# Altium footprint library Reflow3D1411sep.PcbLib: 657 footprints (part 36 of 42)
Each footprint in its own frame and in the unit in brackets; x right, y up, seen from the top. Pads: shape width x height; smd on the part's side, far side on the other; paste and mask are expansions set on the pad; w line width, h text height; cw(c..) or ccw(c..) is an arc to the next point about the centre after c.
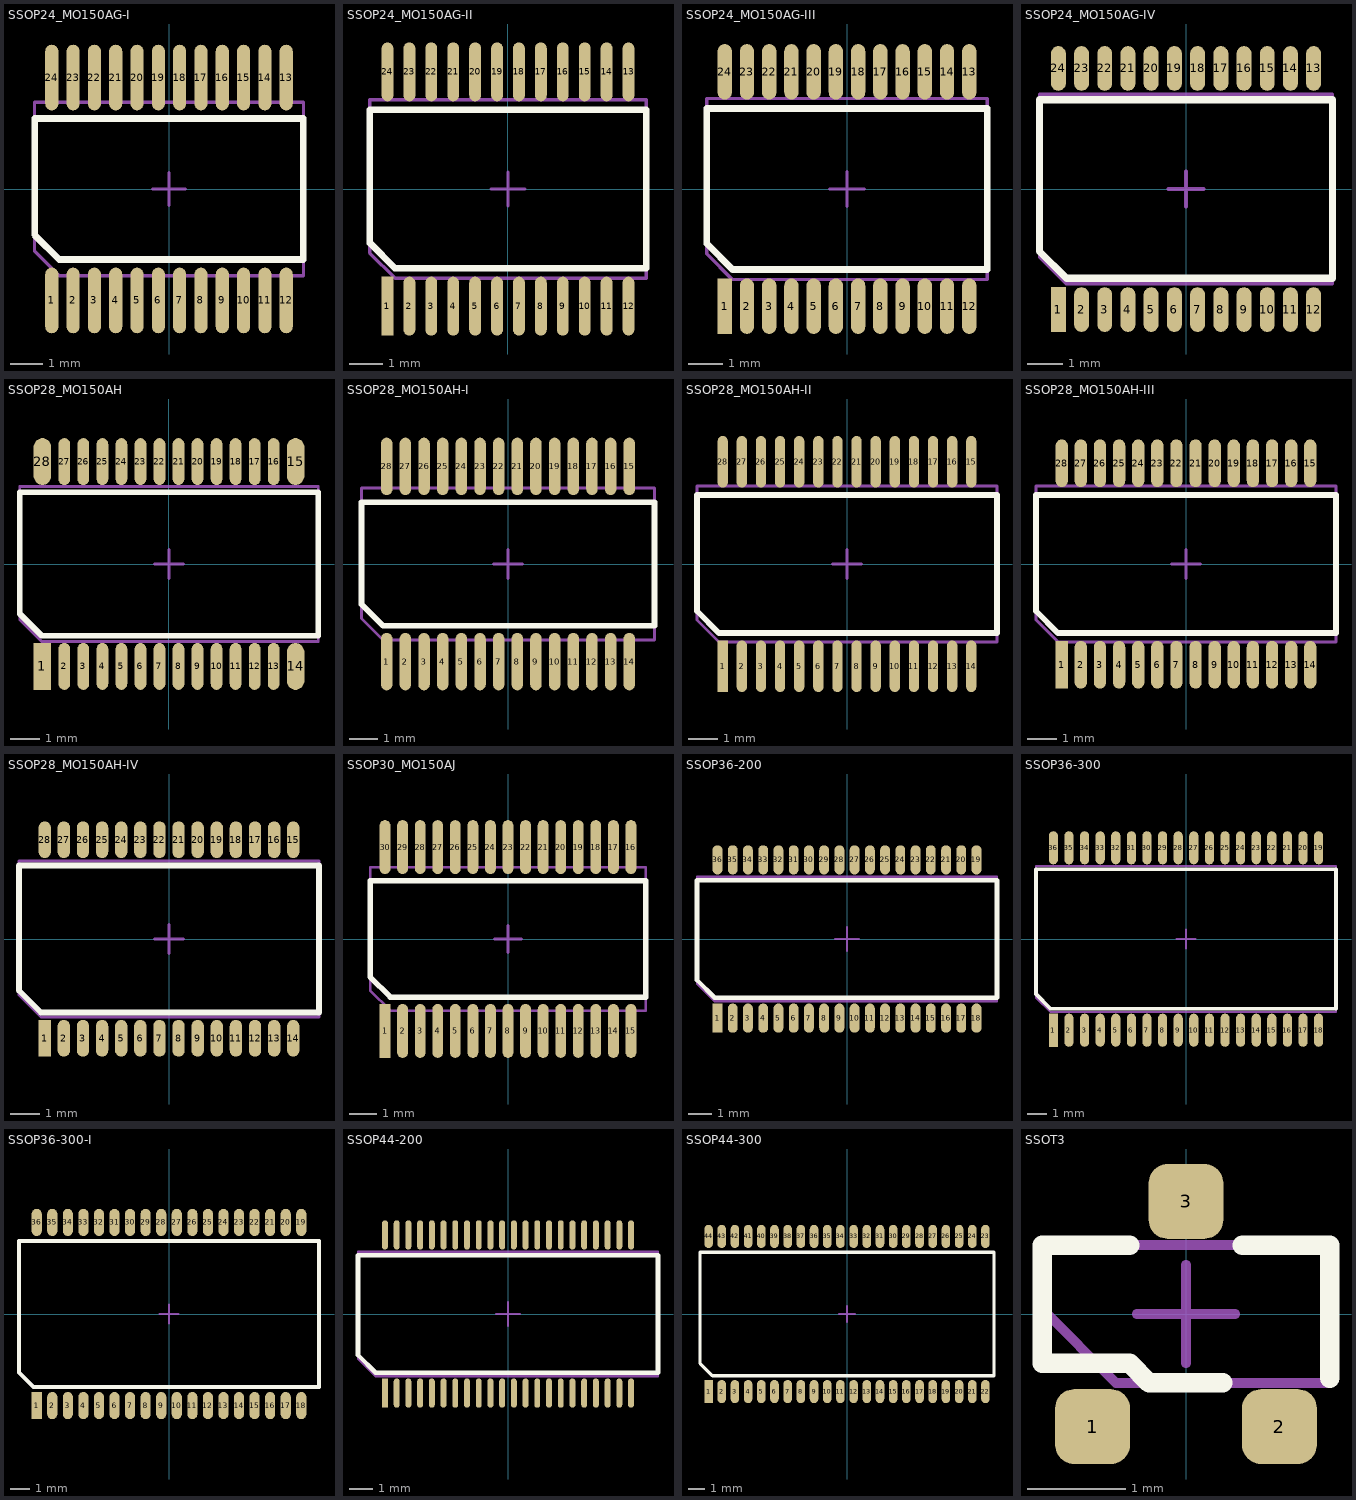
[diagram p35: the footprints below, top view; thin cyan lines are the x and y axes]

## SSOP24_MO150AG-I [mm] "www.ti.com, msso002e.pdf, DB24.asc; www.jedec.org, Mo-150b.pdf"
height 1.85
pads (24):
  oval 0.4x2 smd mask+0.05: 1(-3.575,-3.4) 2(-2.925,-3.4) 3(-2.275,-3.4) 4(-1.625,-3.4) 5(-0.975,-3.4) 6(-0.325,-3.4) 7(0.325,-3.4) 8(0.975,-3.4) 9(1.625,-3.4) 10(2.275,-3.4) 11(2.925,-3.4) 12(3.575,-3.4) 13(3.575,3.4) 14(2.925,3.4) 15(2.275,3.4) 16(1.625,3.4) 17(0.975,3.4) 18(0.325,3.4) 19(-0.325,3.4) 20(-0.975,3.4) 21(-1.625,3.4) 22(-2.275,3.4) 23(-2.925,3.4) 24(-3.575,3.4)
Top Overlay:
  lines w0.2: -4.1,-1.4 -3.35,-2.15 4.1,-2.15 4.1,2.15 -4.1,2.15 -4.1,-1.4
Mechanical 13:
  lines w0.1: -4.1,-1.9 -3.35,-2.65 4.1,-2.65 4.1,2.65 -4.1,2.65 -4.1,-1.9
Mechanical 15:
  lines w0.1: -0.5,0 0.5,0 ; 0,-0.5 0,0.5
3D body: height 2, standoff 0, extent -4.25,-2.8 4.25,2.8

## SSOP24_MO150AG-II [mm] "www.idt.com, PSC4032.pdf"
height 1.86
pads (24):
  rect 0.35x1.75 smd mask+0.075: 1(-3.575,-3.475)
  oval 0.35x1.75 smd mask+0.075: 2(-2.925,-3.475) 3(-2.275,-3.475) 4(-1.625,-3.475) 5(-0.975,-3.475) 6(-0.325,-3.475) 7(0.325,-3.475) 8(0.975,-3.475) 9(1.625,-3.475) 10(2.275,-3.475) 11(2.925,-3.475) 12(3.575,-3.475) 13(3.575,3.475) 14(2.925,3.475) 15(2.275,3.475) 16(1.625,3.475) 17(0.975,3.475) 18(0.325,3.475) 19(-0.325,3.475) 20(-0.975,3.475) 21(-1.625,3.475) 22(-2.275,3.475) 23(-2.925,3.475) 24(-3.575,3.475)
Top Overlay:
  lines w0.2: -4.1,-1.6 -4.1,2.35 4.1,2.35 4.1,-2.35 -3.35,-2.35 -4.1,-1.6
Mechanical 13:
  lines w0.1: -4.1,-1.9 -3.35,-2.65 4.1,-2.65 4.1,2.65 -4.1,2.65 -4.1,-1.9
Mechanical 15:
  lines w0.1: -0.5,0 0.5,0 ; 0,-0.5 0,0.5
3D body: height 1.99, standoff 0, extent -4.165,-2.69 4.165,2.69

## SSOP24_MO150AG-III [mm] "www.maxim-ic.com, 21-0056.PDF, 90-0110.PDF"
height 1.86
pads (24):
  rect 0.42x1.62 smd mask+0.05: 1(-3.575,-3.425)
  oval 0.42x1.62 smd mask+0.05: 2(-2.925,-3.425) 3(-2.275,-3.425) 4(-1.625,-3.425) 5(-0.975,-3.425) 6(-0.325,-3.425) 7(0.325,-3.425) 8(0.975,-3.425) 9(1.625,-3.425) 10(2.275,-3.425) 11(2.925,-3.425) 12(3.575,-3.425) 13(3.575,3.425) 14(2.925,3.425) 15(2.275,3.425) 16(1.625,3.425) 17(0.975,3.425) 18(0.325,3.425) 19(-0.325,3.425) 20(-0.975,3.425) 21(-1.625,3.425) 22(-2.275,3.425) 23(-2.925,3.425) 24(-3.575,3.425)
Top Overlay:
  lines w0.2: -4.1,-1.6 -3.35,-2.35 4.1,-2.35 4.1,2.35 -4.1,2.35 -4.1,-1.6
Mechanical 13:
  lines w0.1: -4.1,-1.895 -4.1,2.645 4.1,2.645 4.1,-2.645 -3.35,-2.645 -4.1,-1.895
Mechanical 15:
  lines w0.1: -0.5,0 0.5,0 ; 0,-0.5 0,0.5
3D body: height 1.99, standoff 0, extent -4.165,-2.69 4.165,2.69

## SSOP24_MO150AG-IV [mm] "www.linear.com, SSOP_24_05-08-1640.pdf; www.jedec.org, Mo-150b.pdf"
height 1.85
pads (24):
  rect 0.42x1.25 smd mask+0.05: 1(-3.575,-3.375)
  oval 0.42x1.25 smd mask+0.05: 2(-2.925,-3.375) 3(-2.275,-3.375) 4(-1.625,-3.375) 5(-0.975,-3.375) 6(-0.325,-3.375) 7(0.325,-3.375) 8(0.975,-3.375) 9(1.625,-3.375) 10(2.275,-3.375) 11(2.925,-3.375) 12(3.575,-3.375) 13(3.575,3.375) 14(2.925,3.375) 15(2.275,3.375) 16(1.625,3.375) 17(0.975,3.375) 18(0.325,3.375) 19(-0.325,3.375) 20(-0.975,3.375) 21(-1.625,3.375) 22(-2.275,3.375) 23(-2.925,3.375) 24(-3.575,3.375)
Top Overlay:
  lines w0.2: -4.1,-1.75 -4.1,2.5 4.1,2.5 4.1,-2.5 -3.35,-2.5 -4.1,-1.75
Mechanical 13:
  lines w0.1: -4.1,-1.9 -4.1,2.65 4.1,2.65 4.1,-2.65 -3.35,-2.65 -4.1,-1.9
Mechanical 15:
  lines w0.1: -0.5,0 0.5,0 ; 0,-0.5 0,0.5
3D body: height 2, standoff 0, extent -4.25,-2.8 4.25,2.8

## SSOP28_MO150AH [mm] "www.nxp.com, sot341-1_po.pdf, SOT341-1_fp_reflow.pdf"
height 1.85
pads (28):
  rect 0.6x1.6 smd mask+0.05: 1(-4.325,-3.5)
  oval 0.4x1.6 smd mask+0.05: 2(-3.575,-3.5) 3(-2.925,-3.5) 4(-2.275,-3.5) 5(-1.625,-3.5) 6(-0.975,-3.5) 7(-0.325,-3.5) 8(0.325,-3.5) 9(0.975,-3.5) 10(1.625,-3.5) 11(2.275,-3.5) 12(2.925,-3.5) 13(3.575,-3.5) 16(3.575,3.5) 17(2.925,3.5) 18(2.275,3.5) 19(1.625,3.5) 20(0.975,3.5) 21(0.325,3.5) 22(-0.325,3.5) 23(-0.975,3.5) 24(-1.625,3.5) 25(-2.275,3.5) 26(-2.925,3.5) 27(-3.575,3.5)
  oval 0.6x1.6 smd mask+0.05: 14(4.325,-3.5) 15(4.325,3.5) 28(-4.325,3.5)
Top Overlay:
  lines w0.2: -5.1,-1.7 -4.35,-2.45 5.1,-2.45 5.1,2.45 -5.1,2.45 -5.1,-1.7
Mechanical 13:
  lines w0.1: -5.1,-1.9 -4.35,-2.65 5.1,-2.65 5.1,2.65 -5.1,2.65 -5.1,-1.9
Mechanical 15:
  lines w0.1: -0.5,0 0.5,0 ; 0,-0.5 0,0.5
3D body: height 2, standoff 0, extent -5.2,-2.7 5.2,2.7

## SSOP28_MO150AH-I [mm] "www.ti.com, msso002e.pdf, DB28.asc; www.jedec.org, Mo-150b.pdf"
height 1.85
pads (28):
  oval 0.4x2 smd mask+0.05: 1(-4.225,-3.4) 2(-3.575,-3.4) 3(-2.925,-3.4) 4(-2.275,-3.4) 5(-1.625,-3.4) 6(-0.975,-3.4) 7(-0.325,-3.4) 8(0.325,-3.4) 9(0.975,-3.4) 10(1.625,-3.4) 11(2.275,-3.4) 12(2.925,-3.4) 13(3.575,-3.4) 14(4.225,-3.4) 15(4.225,3.4) 16(3.575,3.4) 17(2.925,3.4) 18(2.275,3.4) 19(1.625,3.4) 20(0.975,3.4) 21(0.325,3.4) 22(-0.325,3.4) 23(-0.975,3.4) 24(-1.625,3.4) 25(-2.275,3.4) 26(-2.925,3.4) 27(-3.575,3.4) 28(-4.225,3.4)
Top Overlay:
  lines w0.2: -5.1,-1.4 -4.35,-2.15 5.1,-2.15 5.1,2.15 -5.1,2.15 -5.1,-1.4
Mechanical 13:
  lines w0.1: -5.1,-1.9 -4.35,-2.65 5.1,-2.65 5.1,2.65 -5.1,2.65 -5.1,-1.9
Mechanical 15:
  lines w0.1: -0.5,0 0.5,0 ; 0,-0.5 0,0.5
3D body: height 2, standoff 0, extent -5.25,-2.8 5.25,2.8

## SSOP28_MO150AH-II [mm] "www.idt.com, PSC4032.pdf"
height 1.86
pads (28):
  rect 0.35x1.75 smd mask+0.075: 1(-4.225,-3.475)
  oval 0.35x1.75 smd mask+0.075: 2(-3.575,-3.475) 3(-2.925,-3.475) 4(-2.275,-3.475) 5(-1.625,-3.475) 6(-0.975,-3.475) 7(-0.325,-3.475) 8(0.325,-3.475) 9(0.975,-3.475) 10(1.625,-3.475) 11(2.275,-3.475) 12(2.925,-3.475) 13(3.575,-3.475) 14(4.225,-3.475) 15(4.225,3.475) 16(3.575,3.475) 17(2.925,3.475) 18(2.275,3.475) 19(1.625,3.475) 20(0.975,3.475) 21(0.325,3.475) 22(-0.325,3.475) 23(-0.975,3.475) 24(-1.625,3.475) 25(-2.275,3.475) 26(-2.925,3.475) 27(-3.575,3.475) 28(-4.225,3.475)
Top Overlay:
  lines w0.2: -5.1,-1.6 -4.35,-2.35 5.1,-2.35 5.1,2.35 -5.1,2.35 -5.1,-1.6
Mechanical 13:
  lines w0.1: -5.1,-1.9 -5.1,2.65 5.1,2.65 5.1,-2.65 -4.35,-2.65 -5.1,-1.9
Mechanical 15:
  lines w0.1: -0.5,0 0.5,0 ; 0,-0.5 0,0.5
3D body: height 1.99, standoff 0, extent -5.165,-2.69 5.165,2.69

## SSOP28_MO150AH-III [mm] "www.maxim-ic.com, 21-0056.PDF, 90-0095.PDF"
height 1.86
pads (28):
  rect 0.42x1.62 smd mask+0.05: 1(-4.225,-3.425)
  oval 0.42x1.62 smd mask+0.05: 2(-3.575,-3.425) 3(-2.925,-3.425) 4(-2.275,-3.425) 5(-1.625,-3.425) 6(-0.975,-3.425) 7(-0.325,-3.425) 8(0.325,-3.425) 9(0.975,-3.425) 10(1.625,-3.425) 11(2.275,-3.425) 12(2.925,-3.425) 13(3.575,-3.425) 14(4.225,-3.425) 15(4.225,3.425) 16(3.575,3.425) 17(2.925,3.425) 18(2.275,3.425) 19(1.625,3.425) 20(0.975,3.425) 21(0.325,3.425) 22(-0.325,3.425) 23(-0.975,3.425) 24(-1.625,3.425) 25(-2.275,3.425) 26(-2.925,3.425) 27(-3.575,3.425) 28(-4.225,3.425)
Top Overlay:
  lines w0.2: -5.1,-1.6 -4.35,-2.35 5.1,-2.35 5.1,2.35 -5.1,2.35 -5.1,-1.6
Mechanical 13:
  lines w0.1: -5.1,-1.895 -5.1,2.645 5.1,2.645 5.1,-2.645 -4.35,-2.645 -5.1,-1.895
Mechanical 15:
  lines w0.1: -0.5,0 0.5,0 ; 0,-0.5 0,0.5
3D body: height 1.99, standoff 0, extent -5.165,-2.69 5.165,2.69

## SSOP28_MO150AH-IV [mm] "www.linear.com, SSOP_28_05-08-1640.pdf; www.jedec.org, Mo-150b.pdf"
height 1.85
pads (28):
  rect 0.42x1.25 smd mask+0.05: 1(-4.225,-3.375)
  oval 0.42x1.25 smd mask+0.05: 2(-3.575,-3.375) 3(-2.925,-3.375) 4(-2.275,-3.375) 5(-1.625,-3.375) 6(-0.975,-3.375) 7(-0.325,-3.375) 8(0.325,-3.375) 9(0.975,-3.375) 10(1.625,-3.375) 11(2.275,-3.375) 12(2.925,-3.375) 13(3.575,-3.375) 14(4.225,-3.375) 15(4.225,3.375) 16(3.575,3.375) 17(2.925,3.375) 18(2.275,3.375) 19(1.625,3.375) 20(0.975,3.375) 21(0.325,3.375) 22(-0.325,3.375) 23(-0.975,3.375) 24(-1.625,3.375) 25(-2.275,3.375) 26(-2.925,3.375) 27(-3.575,3.375) 28(-4.225,3.375)
Top Overlay:
  lines w0.2: -5.1,-1.75 -5.1,2.5 5.1,2.5 5.1,-2.5 -4.35,-2.5 -5.1,-1.75
Mechanical 13:
  lines w0.1: -5.1,-1.9 -5.1,2.65 5.1,2.65 5.1,-2.65 -4.35,-2.65 -5.1,-1.9
Mechanical 15:
  lines w0.1: -0.5,0 0.5,0 ; 0,-0.5 0,0.5
3D body: height 2, standoff 0, extent -5.25,-2.8 5.25,2.8

## SSOP30_MO150AJ [mm] "www.ti.com, msso002e.pdf, DB30.asc; www.jedec.org, Mo-150b.pdf"
height 1.85
pads (30):
  rect 0.4x2 smd mask+0.05: 1(-4.55,-3.4)
  oval 0.4x2 smd mask+0.05: 2(-3.9,-3.4) 3(-3.25,-3.4) 4(-2.6,-3.4) 5(-1.95,-3.4) 6(-1.3,-3.4) 7(-0.65,-3.4) 8(0,-3.4) 9(0.65,-3.4) 10(1.3,-3.4) 11(1.95,-3.4) 12(2.6,-3.4) 13(3.25,-3.4) 14(3.9,-3.4) 15(4.55,-3.4) 16(4.55,3.4) 17(3.9,3.4) 18(3.25,3.4) 19(2.6,3.4) 20(1.95,3.4) 21(1.3,3.4) 22(0.65,3.4) 23(0,3.4) 24(-0.65,3.4) 25(-1.3,3.4) 26(-1.95,3.4) 27(-2.6,3.4) 28(-3.25,3.4) 29(-3.9,3.4) 30(-4.55,3.4)
Top Overlay:
  lines w0.2: -5.1,-1.4 -5.1,2.15 5.1,2.15 5.1,-2.15 -4.35,-2.15 -5.1,-1.4
Mechanical 13:
  lines w0.1: -5.1,-1.9 -5.1,2.65 5.1,2.65 5.1,-2.65 -4.35,-2.65 -5.1,-1.9
Mechanical 15:
  lines w0.1: -0.5,0 0.5,0 ; 0,-0.5 0,0.5
3D body: height 2, standoff 0, extent -5.25,-2.8 5.25,2.8

## SSOP36-200 [mm] "www.linear.com, SSOP_36_05-08-1640.pdf"
height 1.85
pads (36):
  rect 0.42x1.25 smd mask+0.05: 1(-5.525,-3.375)
  oval 0.42x1.25 smd mask+0.05: 2(-4.875,-3.375) 3(-4.225,-3.375) 4(-3.575,-3.375) 5(-2.925,-3.375) 6(-2.275,-3.375) 7(-1.625,-3.375) 8(-0.975,-3.375) 9(-0.325,-3.375) 10(0.325,-3.375) 11(0.975,-3.375) 12(1.625,-3.375) 13(2.275,-3.375) 14(2.925,-3.375) 15(3.575,-3.375) 16(4.225,-3.375) 17(4.875,-3.375) 18(5.525,-3.375) 19(5.525,3.375) 20(4.875,3.375) 21(4.225,3.375) 22(3.575,3.375) 23(2.925,3.375) 24(2.275,3.375) 25(1.625,3.375) 26(0.975,3.375) 27(0.325,3.375) 28(-0.325,3.375) 29(-0.975,3.375) 30(-1.625,3.375) 31(-2.275,3.375) 32(-2.925,3.375) 33(-3.575,3.375) 34(-4.225,3.375) 35(-4.875,3.375) 36(-5.525,3.375)
Top Overlay:
  lines w0.2: -6.4,-1.75 -5.65,-2.5 6.4,-2.5 6.4,2.5 -6.4,2.5 -6.4,-1.75
Mechanical 13:
  lines w0.1: -6.4,-1.9 -5.65,-2.65 6.4,-2.65 6.4,2.65 -6.4,2.65 -6.4,-1.9
Mechanical 15:
  lines w0.1: -0.5,0 0.5,0 ; 0,-0.5 0,0.5
3D body: height 2, standoff 0, extent -6.55,-2.8 6.55,2.8

## SSOP36-300 [mm] "www.maxim-ic.com, 21-0040.PDF, 90-0098.PDF"
height 2.54
pads (36):
  rect 0.47x1.7 smd mask+0.075: 1(-6.8,-4.675)
  oval 0.47x1.7 smd mask+0.075: 2(-6,-4.675) 3(-5.2,-4.675) 4(-4.4,-4.675) 5(-3.6,-4.675) 6(-2.8,-4.675) 7(-2,-4.675) 8(-1.2,-4.675) 9(-0.4,-4.675) 10(0.4,-4.675) 11(1.2,-4.675) 12(2,-4.675) 13(2.8,-4.675) 14(3.6,-4.675) 15(4.4,-4.675) 16(5.2,-4.675) 17(6,-4.675) 18(6.8,-4.675) 19(6.8,4.675) 20(6,4.675) 21(5.2,4.675) 22(4.4,4.675) 23(3.6,4.675) 24(2.8,4.675) 25(2,4.675) 26(1.2,4.675) 27(0.4,4.675) 28(-0.4,4.675) 29(-1.2,4.675) 30(-2,4.675) 31(-2.8,4.675) 32(-3.6,4.675) 33(-4.4,4.675) 34(-5.2,4.675) 35(-6,4.675) 36(-6.8,4.675)
Top Overlay:
  lines w0.2: -7.69,-2.825 -6.94,-3.575 7.69,-3.575 7.69,3.575 -7.69,3.575 -7.69,-2.825
Mechanical 13:
  lines w0.1: -7.69,-3 -6.94,-3.75 7.69,-3.75 7.69,3.75 -7.69,3.75 -7.69,-3
Mechanical 15:
  lines w0.1: -0.5,0 0.5,0 ; 0,-0.5 0,0.5
3D body: height 2.64, standoff 0, extent -7.775,-3.8 7.775,3.8

## SSOP36-300-I [mm] "www.linear.com, SSOP_36_05-08-1642.pdf"
height 2.54
pads (36):
  rect 0.52x1.4 smd mask+0.05: 1(-6.8,-4.705)
  oval 0.52x1.4 smd mask+0.05: 2(-6,-4.705) 3(-5.2,-4.705) 4(-4.4,-4.705) 5(-3.6,-4.705) 6(-2.8,-4.705) 7(-2,-4.705) 8(-1.2,-4.705) 9(-0.4,-4.705) 10(0.4,-4.705) 11(1.2,-4.705) 12(2,-4.705) 13(2.8,-4.705) 14(3.6,-4.705) 15(4.4,-4.705) 16(5.2,-4.705) 17(6,-4.705) 18(6.8,-4.705) 19(6.8,4.705) 20(6,4.705) 21(5.2,4.705) 22(4.4,4.705) 23(3.6,4.705) 24(2.8,4.705) 25(2,4.705) 26(1.2,4.705) 27(0.4,4.705) 28(-0.4,4.705) 29(-1.2,4.705) 30(-2,4.705) 31(-2.8,4.705) 32(-3.6,4.705) 33(-4.4,4.705) 34(-5.2,4.705) 35(-6,4.705) 36(-6.8,4.705)
Top Overlay:
  lines w0.2: -7.71,-3.005 -7.71,3.755 7.71,3.755 7.71,-3.755 -6.96,-3.755 -7.71,-3.005
Mechanical 13:
  lines w0.1: -7.71,-3.005 -7.71,3.755 7.71,3.755 7.71,-3.755 -6.96,-3.755 -7.71,-3.005
Mechanical 15:
  lines w0.1: -0.5,0 0.5,0 ; 0,-0.5 0,0.5
3D body: height 2.64, standoff 0, extent -7.775,-3.8 7.775,3.8

## SSOP44-200 [mm] "www.linear.com, SSOP_44_05-08-1754.pdf"
height 1.85
pads (44):
  rect 0.25x1.25 smd mask+0.05: 1(-5.25,-3.375)
  oval 0.25x1.25 smd mask+0.05: 2(-4.75,-3.375) 3(-4.25,-3.375) 4(-3.75,-3.375) 5(-3.25,-3.375) 6(-2.75,-3.375) 7(-2.25,-3.375) 8(-1.75,-3.375) 9(-1.25,-3.375) 10(-0.75,-3.375) 11(-0.25,-3.375) 12(0.25,-3.375) 13(0.75,-3.375) 14(1.25,-3.375) 15(1.75,-3.375) 16(2.25,-3.375) 17(2.75,-3.375) 18(3.25,-3.375) 19(3.75,-3.375) 20(4.25,-3.375) 21(4.75,-3.375) 22(5.25,-3.375) 23(5.25,3.375) 24(4.75,3.375) 25(4.25,3.375) 26(3.75,3.375) 27(3.25,3.375) 28(2.75,3.375) 29(2.25,3.375) 30(1.75,3.375) 31(1.25,3.375) 32(0.75,3.375) 33(0.25,3.375) 34(-0.25,3.375) 35(-0.75,3.375) 36(-1.25,3.375) 37(-1.75,3.375) 38(-2.25,3.375) 39(-2.75,3.375) 40(-3.25,3.375) 41(-3.75,3.375) 42(-4.25,3.375) 43(-4.75,3.375) 44(-5.25,3.375)
Top Overlay:
  lines w0.2: -6.4,-1.75 -5.65,-2.5 6.4,-2.5 6.4,2.5 -6.4,2.5 -6.4,-1.75
Mechanical 13:
  lines w0.1: -6.4,-1.9 -5.65,-2.65 6.4,-2.65 6.4,2.65 -6.4,2.65 -6.4,-1.9
Mechanical 15:
  lines w0.1: -0.5,0 0.5,0 ; 0,-0.5 0,0.5
3D body: height 2, standoff 0, extent -6.55,-2.8 6.55,2.8

## SSOP44-300 [mm] "www.linear.com, SSOP_44_05-08-1642.pdf"
height 2.54
pads (44):
  rect 0.52x1.4 smd mask+0.05: 1(-8.4,-4.705)
  oval 0.52x1.4 smd mask+0.05: 2(-7.6,-4.705) 3(-6.8,-4.705) 4(-6,-4.705) 5(-5.2,-4.705) 6(-4.4,-4.705) 7(-3.6,-4.705) 8(-2.8,-4.705) 9(-2,-4.705) 10(-1.2,-4.705) 11(-0.4,-4.705) 12(0.4,-4.705) 13(1.2,-4.705) 14(2,-4.705) 15(2.8,-4.705) 16(3.6,-4.705) 17(4.4,-4.705) 18(5.2,-4.705) 19(6,-4.705) 20(6.8,-4.705) 21(7.6,-4.705) 22(8.4,-4.705) 23(8.4,4.705) 24(7.6,4.705) 25(6.8,4.705) 26(6,4.705) 27(5.2,4.705) 28(4.4,4.705) 29(3.6,4.705) 30(2.8,4.705) 31(2,4.705) 32(1.2,4.705) 33(0.4,4.705) 34(-0.4,4.705) 35(-1.2,4.705) 36(-2,4.705) 37(-2.8,4.705) 38(-3.6,4.705) 39(-4.4,4.705) 40(-5.2,4.705) 41(-6,4.705) 42(-6.8,4.705) 43(-7.6,4.705) 44(-8.4,4.705)
Top Overlay:
  lines w0.2: -8.915,-3.005 -8.915,3.755 8.915,3.755 8.915,-3.755 -8.165,-3.755 -8.915,-3.005
Mechanical 13:
  lines w0.1: -8.915,-3.005 -8.915,3.755 8.915,3.755 8.915,-3.755 -8.165,-3.755 -8.915,-3.005
Mechanical 15:
  lines w0.1: -0.5,0 0.5,0 ; 0,-0.5 0,0.5
3D body: height 2.64, standoff 0, extent -8.965,-3.8 8.965,3.8

## SSOT3 [mm] "www.fairchildsemi.com, MA03B.pdf; www.national.com, ma03b.pdf"
height 1
pads (3):
  rrect50% 0.76x0.76 smd mask+0.075: 1(-0.95,-1.145) 2(0.95,-1.145) 3(0,1.145)
Top Overlay:
  lines w0.2: -0.575,0.7 -1.46,0.7 -1.46,-0.5 -0.575,-0.5 -0.375,-0.7 0.375,-0.7 ; 0.575,0.7 1.46,0.7 1.46,-0.65
Mechanical 13:
  lines w0.1: -1.46,0.05 -0.71,-0.7 1.46,-0.7 1.46,0.7 -1.46,0.7 -1.46,0.05
Mechanical 15:
  lines w0.1: -0.5,0 0.5,0 ; 0,-0.5 0,0.5
3D body: height 1.12, standoff 0, extent -1.52,-0.76 1.52,0.76